# Altium footprint library Cap.PcbLib: 102 footprints (part 1 of 7)
Each footprint in its own frame and in the unit in brackets; x right, y up, seen from the top. Pads: shape width x height; smd on the part's side, far side on the other; paste and mask are expansions set on the pad; w line width, h text height; cw(c..) or ccw(c..) is an arc to the next point about the centre after c.
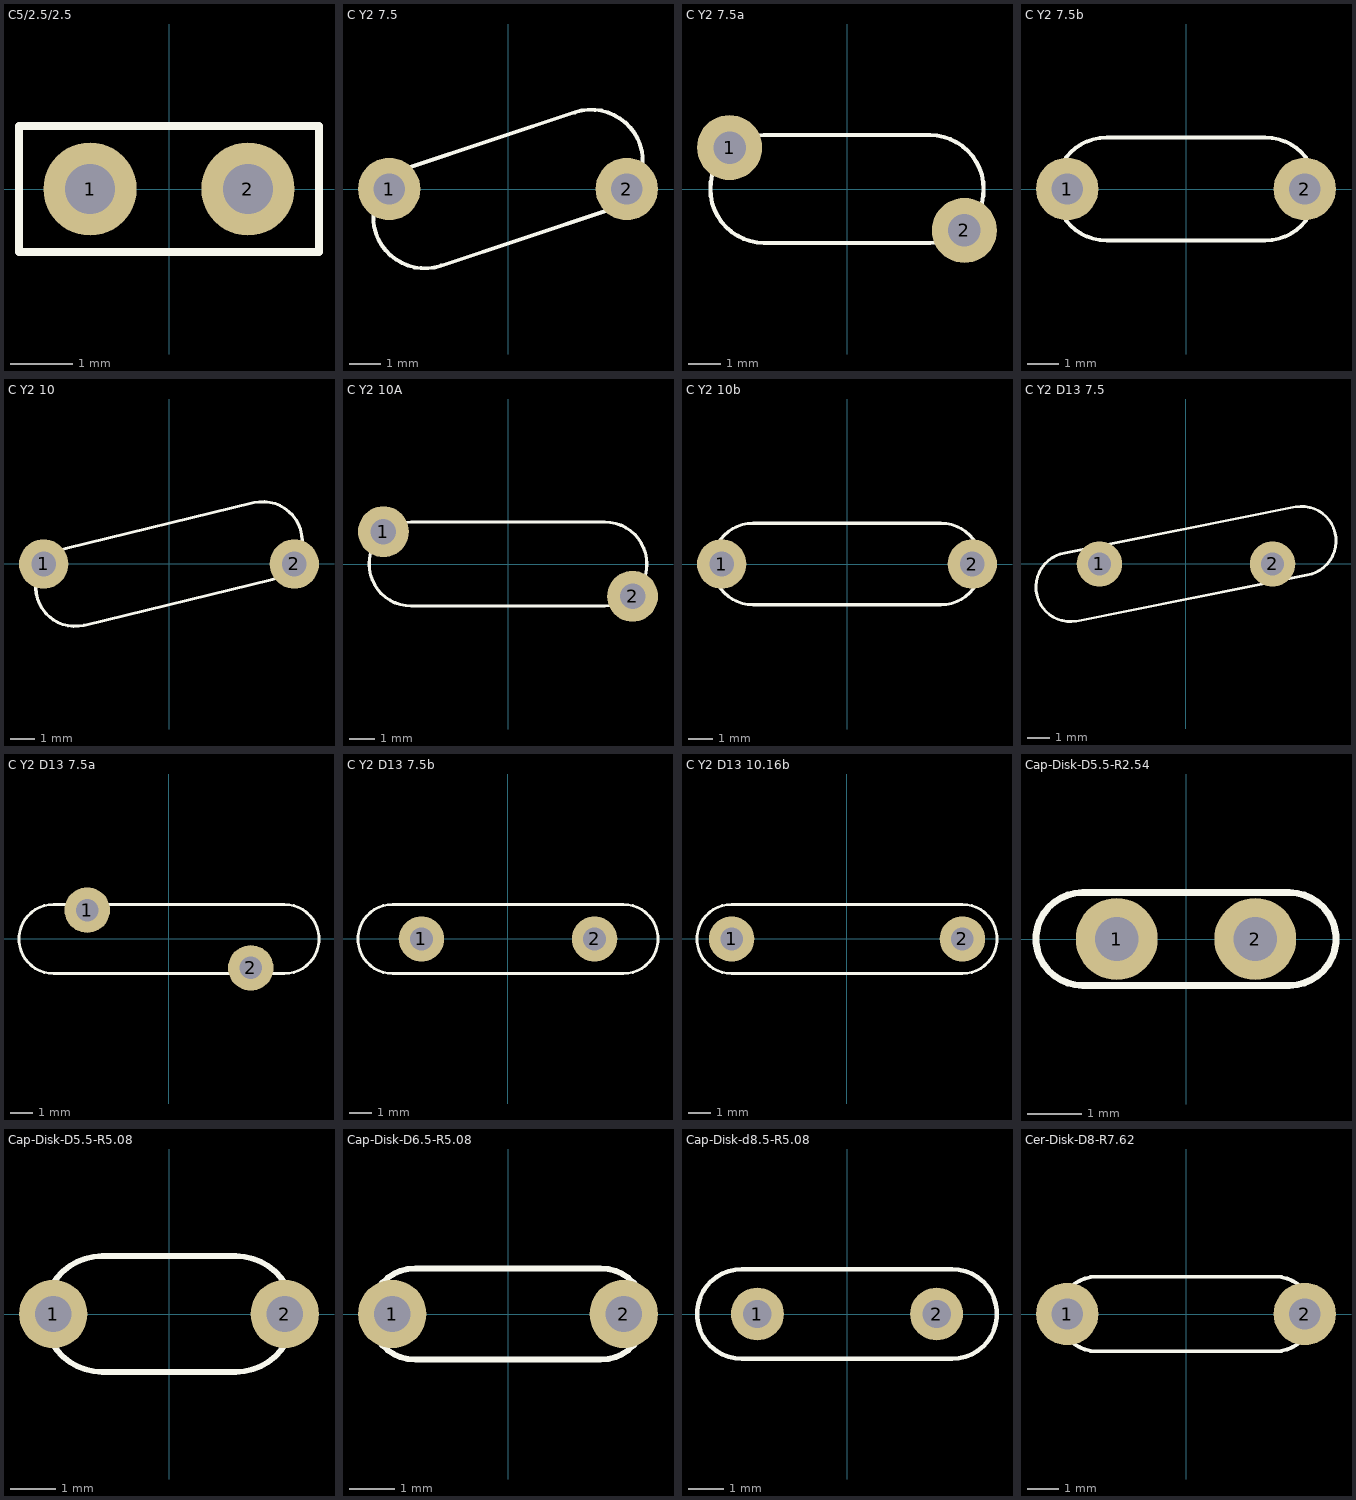
[diagram p0: the footprints below, top view; thin cyan lines are the x and y axes]

## C5/2.5/2.5 [mm]
pads (2):
  round 1.5 hole 0.8: 1(-1.27,0) 2(1.27,0)
TopOverlay:
  lines w0.127: -2.413,-1.016 -2.413,1.016 2.413,1.016 2.413,-1.016 -2.413,-1.016

## C Y2 7.5 [mm]
pads (2):
  round 2 hole 1: 1(-3.81,0) 2(3.81,0)
TopOverlay:
  lines w0.127: -3.191,0.683 ccw(c-2.667,-0.888) -2.143,-2.46 3.175,-0.686 ; -3.175,0.686 2.143,2.46 cw(c2.667,0.888) 3.191,-0.683

## C Y2 7.5a [mm]
pads (2):
  round 2 hole 1: 1(-3.6,1.27) 2(3.6,-1.27)
TopOverlay:
  lines w0.127: -2.54,-1.651 cw(c-2.54,0) -2.54,1.651 2.54,1.651 cw(c2.54,0) 2.54,-1.651 -2.54,-1.651

## C Y2 7.5b [mm]
pads (2):
  round 2 hole 1: 1(-3.81,0) 2(3.81,0)
TopOverlay:
  lines w0.127: -2.54,-1.651 cw(c-2.54,0) -2.54,1.651 2.54,1.651 cw(c2.54,0) 2.54,-1.651 -2.54,-1.651
3D body "Ceramic Disc Y1 D10 F7.62mm.STEP": height 12.5, standoff -2.5, extent -4.988,-2 4.989,2

## C Y2 10 [mm]
pads (2):
  round 2 hole 1: 1(-5.08,0) 2(5.08,0)
TopOverlay:
  lines w0.127: -4.189,0.626 ccw(c-3.803,-0.927) -3.442,-2.485 4.189,-0.626 ccw(c3.8,0.926) 3.442,2.485 -4.189,0.626

## C Y2 10A [mm]
pads (2):
  round 2 hole 1: 1(-4.9,1.27) 2(4.9,-1.27)
TopOverlay:
  lines w0.127: -3.81,-1.651 cw(c-3.81,0) -3.81,1.651 3.81,1.651 cw(c3.81,0) 3.81,-1.651 -3.81,-1.651

## C Y2 10b [mm]
pads (2):
  round 2 hole 1: 1(-5.08,0) 2(5.08,0)
TopOverlay:
  lines w0.127: -3.81,-1.651 cw(c-3.81,0) -3.81,1.651 3.81,1.651 cw(c3.81,0) 3.81,-1.651 -3.81,-1.651
3D body "Ceramic Disc Y1 D10 F10.16mm.STEP": height 12.5, standoff -2.5, extent -5.834,-2 5.834,2

## C Y2 D13 7.5 [mm]
pads (2):
  round 2 hole 1: 1(-3.81,0) 2(3.81,0)
TopOverlay:
  lines w0.127: -5.331,0.487 ccw(c-5.08,-1.016) -4.829,-2.519 5.331,-0.487 ccw(c5.08,1.016) 4.829,2.519 -5.331,0.487

## C Y2 D13 7.5a [mm]
pads (2):
  round 2 hole 1: 1(-3.6,1.27) 2(3.6,-1.27)
TopOverlay:
  lines w0.127: -5.08,-1.524 cw(c-5.08,0) -5.08,1.524 5.08,1.524 cw(c5.08,0) 5.08,-1.524 -5.08,-1.524

## C Y2 D13 7.5b [mm]
pads (2):
  round 2 hole 1: 1(-3.81,0) 2(3.81,0)
TopOverlay:
  lines w0.127: -5.08,-1.524 cw(c-5.08,0) -5.08,1.524 5.08,1.524 cw(c5.08,0) 5.08,-1.524 -5.08,-1.524
3D body "Ceramic Disc Y1 D13 F7.62mm.STEP": height 15.5, standoff -2.5, extent -6.489,-2 6.49,2

## C Y2 D13 10.16b [mm]
pads (2):
  round 2 hole 1: 1(-5.08,0) 2(5.08,0)
TopOverlay:
  lines w0.127: -5.08,-1.524 cw(c-5.08,0) -5.08,1.524 5.08,1.524 cw(c5.08,0) 5.08,-1.524 -5.08,-1.524
3D body "Ceramic Disc Y1 D13 F10.16mm.STEP": height 15.5, standoff -2.5, extent -6.495,-2 6.495,2

## Cap-Disk-D5.5-R2.54 [mm]
pads (2):
  round 1.5 hole 0.8: 1(-1.27,0) 2(1.27,0)
TopOverlay:
  lines w0.127: -1.9,-0.85 cw(c-1.9,0) -1.9,0.85 1.9,0.85 cw(c1.9,0) 1.9,-0.85 -1.9,-0.85
3D body "Cap-Disk-f5.5-R2.54.STEP": height 6.25, standoff -1.5, extent -2.743,-0.86 2.75,0.86

## Cap-Disk-D5.5-R5.08 [mm]
pads (2):
  round 1.5 hole 0.8: 1(-2.54,0) 2(2.54,0)
TopOverlay:
  lines w0.127: -1.467,-1.27 cw(c-1.467,0) -1.467,1.27 1.467,1.27 cw(c1.467,0) 1.467,-1.27 -1.467,-1.27
3D body "Cap-Disk-f5.5-R5.08.STEP": height 7.62, standoff -2.54, extent -2.73,-1.275 2.731,1.267

## Cap-Disk-D6.5-R5.08 [mm]
pads (2):
  round 1.5 hole 0.8: 1(-2.54,0) 2(2.54,0)
TopOverlay:
  lines w0.127: -2.032,-1 cw(c-2.032,0) -2.032,1 2.032,1 cw(c2.032,0) 2.032,-1 -2.032,-1
3D body "Cap-Disk-f6.5-R5.08.STEP": height 6.6, standoff -1.5, extent -3.094,-1.01 3.1,1.01

## Cap-Disk-d8.5-R5.08 [mm]
pads (2):
  round 1.5 hole 0.8: 1(-2.54,0) 2(2.54,0)
TopOverlay:
  lines w0.127: -2.98,-1.27 cw(c-2.98,0) -2.98,1.27 2.98,1.27 cw(c2.98,0) 2.98,-1.27 -2.98,-1.27
3D body "Cap-Ceramic Disc-D8.5-F5.08.STEP": height 9.25, standoff -1.79, extent -4.248,-1.26 4.25,1.26

## Cer-Disk-D8-R7.62 [mm]
pads (2):
  round 2 hole 1: 1(-3.81,0) 2(3.81,0)
TopOverlay:
  lines w0.127: -2.87,-1.195 cw(c-2.87,0) -2.87,1.195 2.87,1.195 cw(c2.87,0) 2.87,-1.195 -2.87,-1.195
3D body "Cer-Disc R7.62.STEP": height 10.03, standoff -3.16, extent -4,-1.198 4.001,1.195